# Altium footprint library OT Library.PcbLib: 396 footprints (part 21 of 25)
Each footprint in its own frame and in the unit in brackets; x right, y up, seen from the top. Pads: shape width x height; smd on the part's side, far side on the other; paste and mask are expansions set on the pad; w line width, h text height; cw(c..) or ccw(c..) is an arc to the next point about the centre after c.
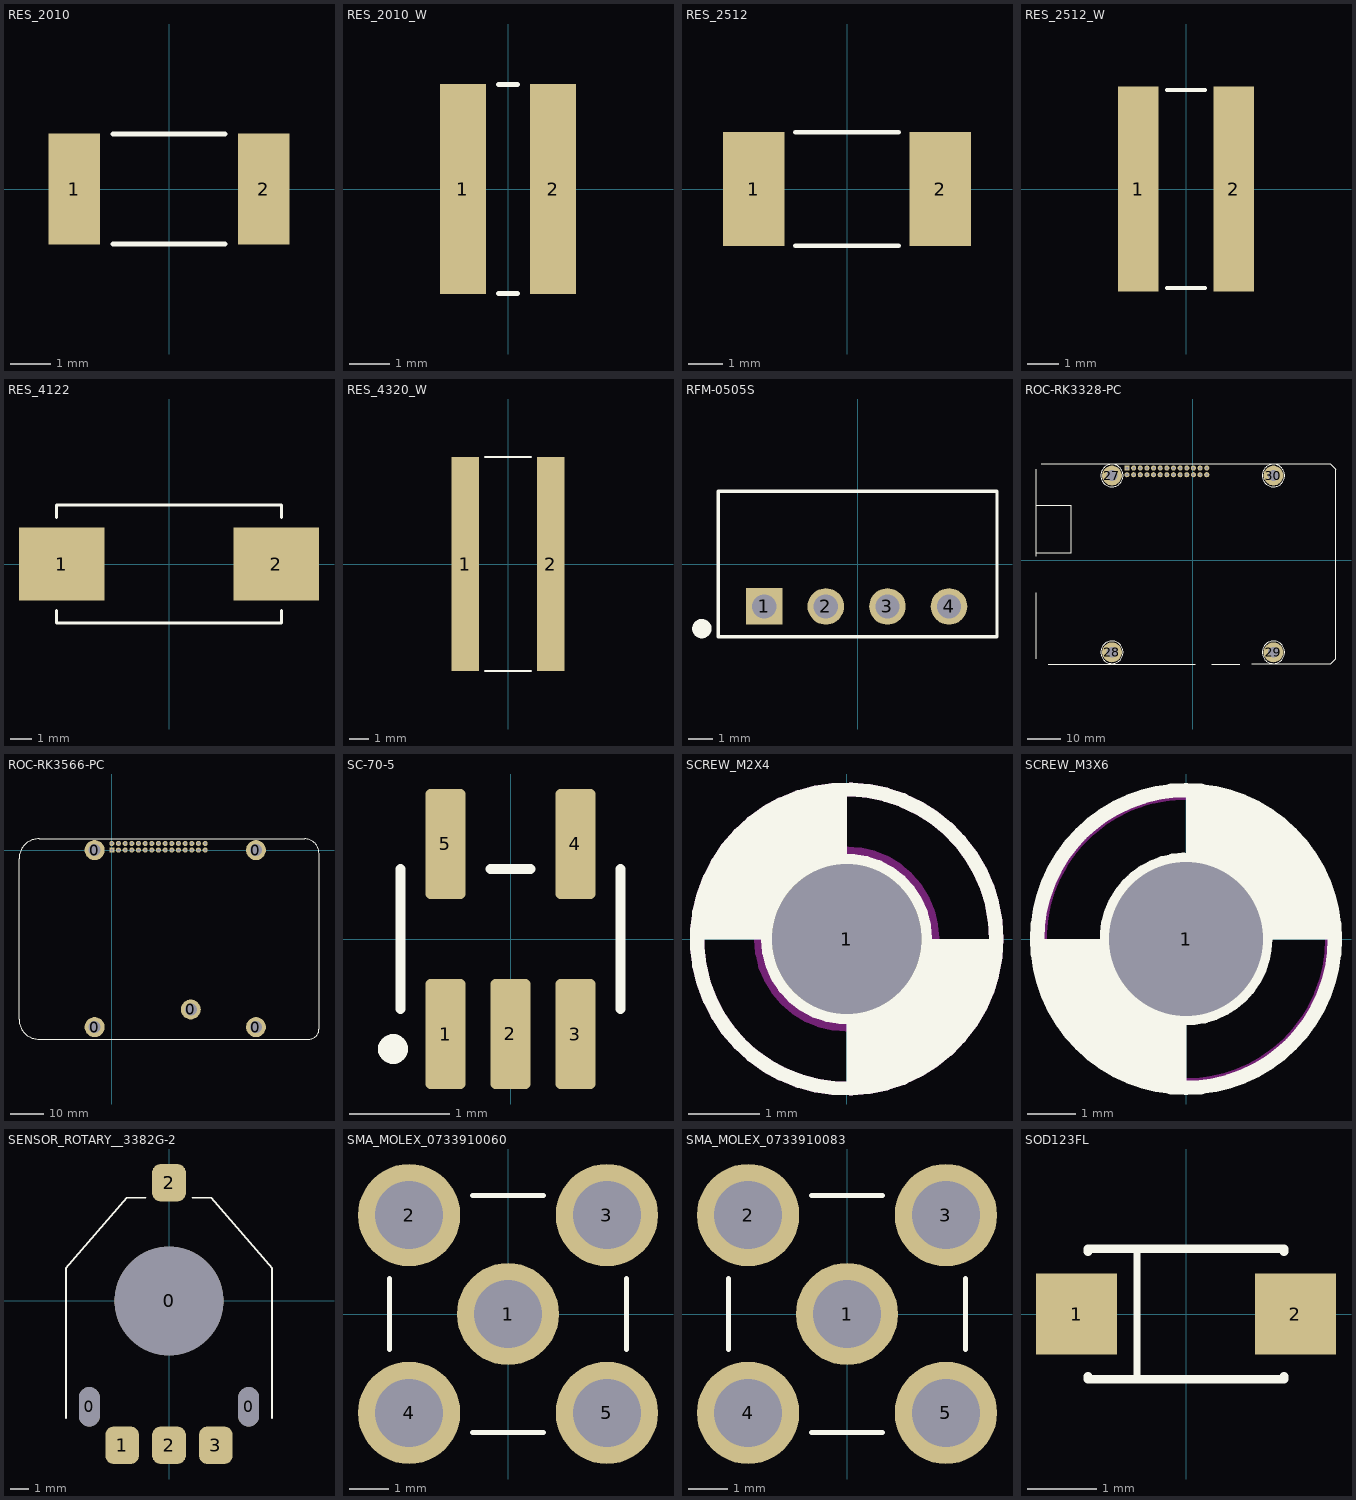
[diagram p20: the footprints below, top view; thin cyan lines are the x and y axes]

## RES_2010 [mm] "0.197\" L x 0.098\" W (5.00mm x 2.50mm)"
height 0.7
pads (2):
  rect 1.26x2.72 smd: 1(-2.325,0) 2(2.325,0)
Top Overlay:
  lines w0.127: -1.37,-1.35 1.37,-1.35 ; -1.37,1.35 1.37,1.35
3D body: height 0.7, standoff 0, extent -2.5,-1.25 2.5,1.25

## RES_2010_W [mm] "0.200\" L x 0.100\" W (5.08mm x 2.54mm)"
height 0.76
pads (2):
  rect 1.15x5.23 smd: 1(-1.123,0) 2(1.123,0)
Top Overlay:
  lines w0.127: -0.23,-2.6 0.23,-2.6 ; -0.23,2.6 0.23,2.6
3D body: height 0.68, standoff 0, extent -1.27,-2.54 1.27,2.54

## RES_2512 [mm] "0.250\" L x 0.120\" W (6.35mm x 3.05mm)"
height 0.9
pads (2):
  rect 1.78x3.31 smd: 1(-2.718,0) 2(2.718,0)
Top Overlay:
  lines w0.127: -1.51,-1.65 1.51,-1.65 ; -1.51,1.65 1.51,1.65
3D body: height 0.9, standoff 0, extent -3.175,-1.525 3.175,1.525

## RES_2512_W [mm] "0.122\" L x 0.248\" W (3.10mm x 6.30mm)"
height 0.7
pads (2):
  rect 1.29x6.52 smd: 1(-1.515,0) 2(1.515,0)
Top Overlay:
  lines w0.127: -0.6,-3.15 0.6,-3.15 ; -0.6,3.15 0.6,3.15
3D body: height 0.7, standoff 0, extent -1.55,-3.15 1.55,3.15

## RES_4122 [mm] "0.413\" L x 0.217\" W (10.50mm x 5.50mm)"
height 5.3
pads (2):
  rect 4x3.4 smd: 1(-5,0) 2(5,0)
Top Overlay:
  lines w0.127: -5.25,-2.175 -5.25,-2.75 5.25,-2.75 5.25,-2.175 ; -5.25,2.175 -5.25,2.75 5.25,2.75 5.25,2.175
3D body: height 5, standoff 0, extent -5.31,-2.75 5.31,2.75

## RES_4320_W [mm] "0.197\" L x 0.433\" W (5.00mm x 11.00mm)"
height 0.7
pads (2):
  rect 1.44x11.22 smd: 1(-2.24,0) 2(2.24,0)
Top Overlay:
  lines w0.127: -1.2,-5.6 1.2,-5.6 ; -1.2,5.6 1.2,5.6
3D body: height 0.7, standoff 0, extent -2.5,-5.5 2.5,5.5

## RFM-0505S [mm] "0.45\" L x 0.24\" W x 0.39\" H (11.5mm x 6.0mm x 10.0mm)"
pads (4):
  rect 1.508x1.508 hole 1: 1(-3.85,-1.75)
  round 1.508 hole 1: 2(-1.31,-1.75) 3(1.23,-1.75) 4(3.77,-1.75)
Top Overlay:
  circle w0.4: c-6.426,-2.667 r0.2
  lines w0.127: -5.75,-3 -5.75,3 5.75,3 5.75,-3 -5.75,-3
3D body: height 9.5, standoff -4.6, extent -5.75,-3 5.75,3

## ROC-RK3328-PC [mil]
pads (30):
  rect 60x60 hole 30: 1(-778.54,1091.54)
  round 60 hole 30: 2(-778.54,1012.8) 3(-699.8,1091.54) 4(-699.8,1012.8) 5(-621.06,1091.54) 6(-621.06,1012.8) 7(-542.32,1091.54) 8(-542.32,1012.8) 9(-463.58,1091.54) 10(-463.58,1012.8) 11(-384.84,1091.54) 12(-384.84,1012.8) 13(-306.1,1091.54) 14(-306.1,1012.8) 15(-227.36,1091.54) 16(-227.36,1012.8) 17(-148.62,1091.54) 18(-148.62,1012.8) 19(-69.88,1091.54) 20(-69.88,1012.8) 21(8.86,1091.54) 22(8.86,1012.8) 23(87.6,1091.54) 24(87.6,1012.8) 25(166.34,1091.54) 26(166.34,1012.8)
  round 236.22 hole 125.98: 27(-956.69,1002.95) 28(-956.69,-1091.54) 29(956.69,-1091.54) 30(956.69,1002.95)
Top Overlay:
  circle w10: c-956.69,1002.95 r132.96
  circle w10: c956.69,1002.95 r132.96
  circle w10: c956.69,-1091.54 r132.96
  circle w10: c-956.69,-1091.54 r132.96
  lines w12: -1856.48,-1170 -1856.48,-383.52 ; -1856.48,45 -1856.48,1078.52 ; -1856.48,91.36 -1437.45,91.36 -1437.45,651.4 ; -1856.48,652.89 -1437.45,652.89 ; -1794.25,1140.75 1631.86,1140.75 1697.61,1075 1697.61,-1165 1633.77,-1228.84 698.84,-1228.84 ; -1710,-1230 30,-1230 ; 225,-1230.5 555,-1230.5
3D body: height 708.66, standoff 114.17, extent -1930.29,-1226.85 1757.16,1140.86

## ROC-RK3566-PC [mil]
pads (35):
  round 236.22 hole 141.73: 0(-202.76,-2090.55) 0(-202.76,0) 0(932.36,-1882.48) 0(1702.76,-2090.55) 0(1702.76,0)
  rect 60x60 hole 30: 1(0,0)
  round 60 hole 30: 2(0,78.74) 3(78.74,0) 4(78.74,78.74) 5(157.48,0) 6(157.48,78.74) 7(236.22,0) 8(236.22,78.74) 9(314.96,0) 10(314.96,78.74) 11(393.7,0) 12(393.7,78.74) 13(472.44,0) 14(472.44,78.74) 15(551.18,0) 16(551.18,78.74) 17(629.92,0) 18(629.92,78.74) 19(708.66,0) 20(708.66,78.74) 21(787.4,0) 22(787.4,78.74) 23(866.14,0) 24(866.14,78.74) 25(944.88,0) 26(944.88,78.74) 27(1023.62,0) 28(1023.62,78.74) 29(1102.36,0) 30(1102.36,78.74)
Top Overlay:
  lines w7.87: -1096.22,-1997 ccw(c-860,-1997) -860,-2233.22 2328.4,-2233.22 ccw(c2328.4,-2114.53) 2447.09,-2114.53 2447.09,-37.69 ccw(c2276.48,-37.69) 2276.48,132.93 2210.87,132.93 -860,132.93 ccw(c-860,-103.3) -1096.22,-103.3 -1096.22,-1997
3D body: height 307.44, standoff -194.09, extent -1179.98,-2230 2499.98,137.72

## SC-70-5 [mm]
height 1
pads (5):
  rrect25% 0.4x1.1 smd mask+0.051: 1(-0.65,-0.95) 2(0,-0.95) 3(0.65,-0.95) 4(0.65,0.95) 5(-0.65,0.95)
Top Overlay:
  circle w0.15: c-1.175,-1.1 r0.075
  lines w0.1: -1.1,-0.7 -1.1,0.7 ; -0.2,0.7 0.2,0.7 ; 1.1,-0.7 1.1,0.7
3D body: height 1.1, standoff 0, extent -1.1,-1.2 1.1,1.2

## SCREW_M2X4 [mm]
pads (1):
  round 2.1 hole 2.1: 1(0,0)
Top Overlay:
  circle w0.2: c0,0 r2.1
  circle w0.2: c0,0 r1.1
  region: 0,2.032 0,1.025 -0.265,0.99 -0.512,0.887 -0.725,0.725 -0.887,0.512 -0.99,0.265 -1.025,0 -1.016,0 -2.042,0 -2.003,0.398 -1.886,0.781 -1.698,1.134 -1.444,1.444 -1.134,1.698 -0.781,1.886 -0.398,2.003 0,2.042
  region: 0,-1.016 0,-2.032 0.068,-2.042 0.466,-2.003 0.849,-1.886 1.202,-1.698 1.512,-1.444 1.766,-1.134 1.954,-0.781 2.071,-0.398 2.11,0 2.1,0 1.109,0 1.074,-0.265 0.971,-0.512 0.809,-0.725 0.596,-0.887 0.349,-0.99 0.084,-1.025 0.084,-1.016
Keep-Out Layer:
  circle w0.2: c0,0 r2.1
  circle w0.2: c0,0 r1.2
3D body: height 1, standoff -3, extent -2,-2 2,2

## SCREW_M3X6 [mm]
pads (1):
  round 3.2 hole 3.2: 1(0,0)
Top Overlay:
  circle w0.3: c0,0 r1.65
  circle w0.3: c0,0 r3.1
  region: 0,3.124 0.737,3.124 0.965,2.896 1.372,2.896 1.778,2.489 1.854,2.489 2.54,1.803 2.54,1.676 2.794,1.422 2.794,1.143 3.048,0.889 3.048,0.203 3.1,0.151 3.1,0 1.65,0 1.65,0.56 1.27,0.94 1.27,1.092 0.838,1.524 0.152,1.524 0,1.676
  region: 0,-3.124 -0.737,-3.124 -0.965,-2.896 -1.372,-2.896 -1.778,-2.489 -1.854,-2.489 -2.54,-1.803 -2.54,-1.676 -2.794,-1.422 -2.794,-1.143 -3.048,-0.889 -3.048,-0.203 -3.1,-0.151 -3.1,0 -1.65,0 -1.65,-0.56 -1.27,-0.94 -1.27,-1.092 -0.838,-1.524 -0.152,-1.524 0,-1.676
Keep-Out Layer:
  circle w0.2: c0,0 r3
3D body: height 1.5, standoff -4.5, extent -3.002,-3.001 3.001,3.001

## SENSOR_ROTARY__3382G-2 [mm]
pads (7):
  oval 1.1x2.1 hole 1.1 slot 2.1 at 90 deg: 0(-4.25,-5.65) 0(4.25,-5.65)
  round 5.8 hole 5.8: 0(0,0)
  rrect50% 1.8x2 smd: 1(-2.5,-7.7) 2(0,-7.7) 2(0,6.3) 3(2.5,-7.7)
Top Overlay:
  lines w0.1: -5.5,-6.25 -5.5,1.75 -2.25,5.5 -1.25,5.5 ; 1.25,5.5 2.25,5.5 5.5,1.75 5.5,-6.25
3D body: height 2.13, standoff -0.82, extent -5.512,-8.266 5.512,6.634

## SMA_MOLEX_0733910060 [mm]
height 9.5
pads (5):
  round 2.625 hole 1.75: 1(0,0) 2(-2.54,2.54) 3(2.54,2.54) 4(-2.54,-2.54) 5(2.54,-2.54)
Top Overlay:
  lines w0.127: -3.04,-0.914 -3.04,0.914 ; -0.914,-3.04 0.914,-3.04 ; -0.914,3.04 0.914,3.04 ; 3.04,-0.914 3.04,0.914
3D body: height 9.8, standoff -3.7, extent -3.129,-3.128 3.129,3.128

## SMA_MOLEX_0733910083 [mm]
height 9.5
pads (5):
  round 2.625 hole 1.75: 1(0,0) 2(-2.54,2.54) 3(2.54,2.54) 4(-2.54,-2.54) 5(2.54,-2.54)
Top Overlay:
  lines w0.127: -3.04,-0.914 -3.04,0.914 ; -0.914,-3.04 0.914,-3.04 ; -0.914,3.04 0.914,3.04 ; 3.04,-0.914 3.04,0.914
3D body: height 10.07, standoff -3.43, extent -3.2,-11.642 3.15,3.158

## SOD123FL [mm]
pads (2):
  rect 1.18x1.17 smd: 1(-1.59,0) 2(1.59,0)
Top Overlay:
  lines w0.1: -0.711,-0.94 -0.711,0.94
  lines w0.127: -1.425,-0.905 -1.425,-0.95 1.425,-0.95 1.425,-0.905 ; -1.425,0.905 -1.425,0.95 1.425,0.95 1.425,0.905
3D body: height 1.35, standoff 0, extent -1.85,-0.95 1.85,0.95